# Altium footprint library surface.PcbLib: 97 footprints (part 7 of 7)
Each footprint in its own frame and in the unit in brackets; x right, y up, seen from the top. Pads: shape width x height; smd on the part's side, far side on the other; paste and mask are expansions set on the pad; w line width, h text height; cw(c..) or ccw(c..) is an arc to the next point about the centre after c.
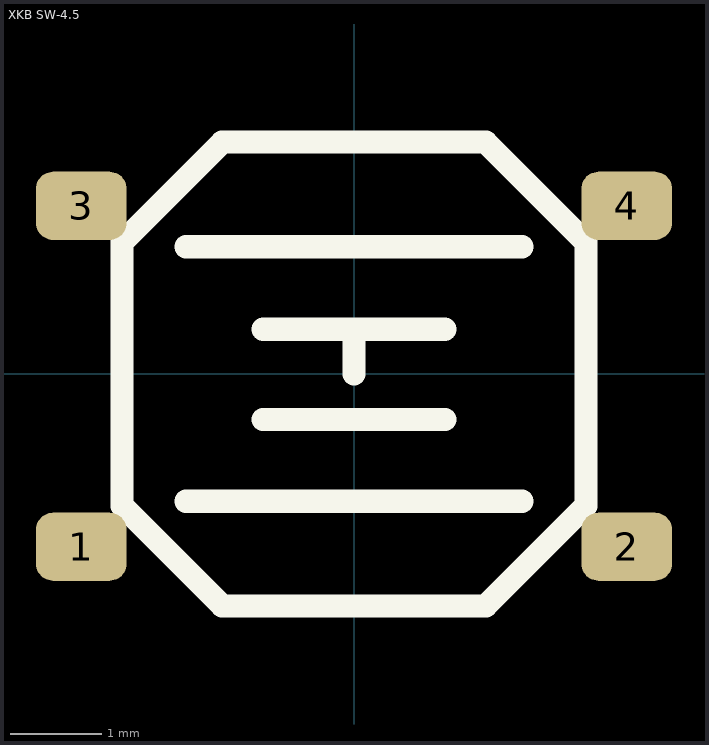
[diagram p6: the footprint, top view; thin cyan lines are the x and y axes]

## XKB SW-4.5 [mm]
pads (4):
  rrect50% 1x0.75 smd: 1(-3,-1.9) 2(3,-1.9) 3(-3,1.85) 4(3,1.85)
Top Overlay:
  lines w0.254: -1.85,-1.4 1.85,-1.4 ; -1.85,1.4 1.85,1.4 ; -1,-0.5 1,-0.5 ; -0.998,0.492 0.998,0.492 ; 0,0 0,0.492 ; -2.55,-1.45 -1.45,-2.55 1.45,-2.55 2.55,-1.45 2.55,1.45 1.45,2.55 -1.45,2.55 -2.55,1.45 -2.55,-1.45
3D body: height 1, standoff 0, extent -2.55,-2.55 2.55,2.55
3D body: height 1.2, standoff 0, extent -1.85,-1.85 1.85,1.85
3D body: height 1.35, standoff 0, extent -0.992,-0.998 1,0.998
3D body: height 0.25, standoff 0, extent -3,1.75 3,2
3D body: height 0.25, standoff 0, extent -3,-2 3,-1.75